# Altium footprint library 学习.PcbLib: 96 footprints (part 3 of 6)
Each footprint in its own frame and in the unit in brackets; x right, y up, seen from the top. Pads: shape width x height; smd on the part's side, far side on the other; paste and mask are expansions set on the pad; w line width, h text height; cw(c..) or ccw(c..) is an arc to the next point about the centre after c.
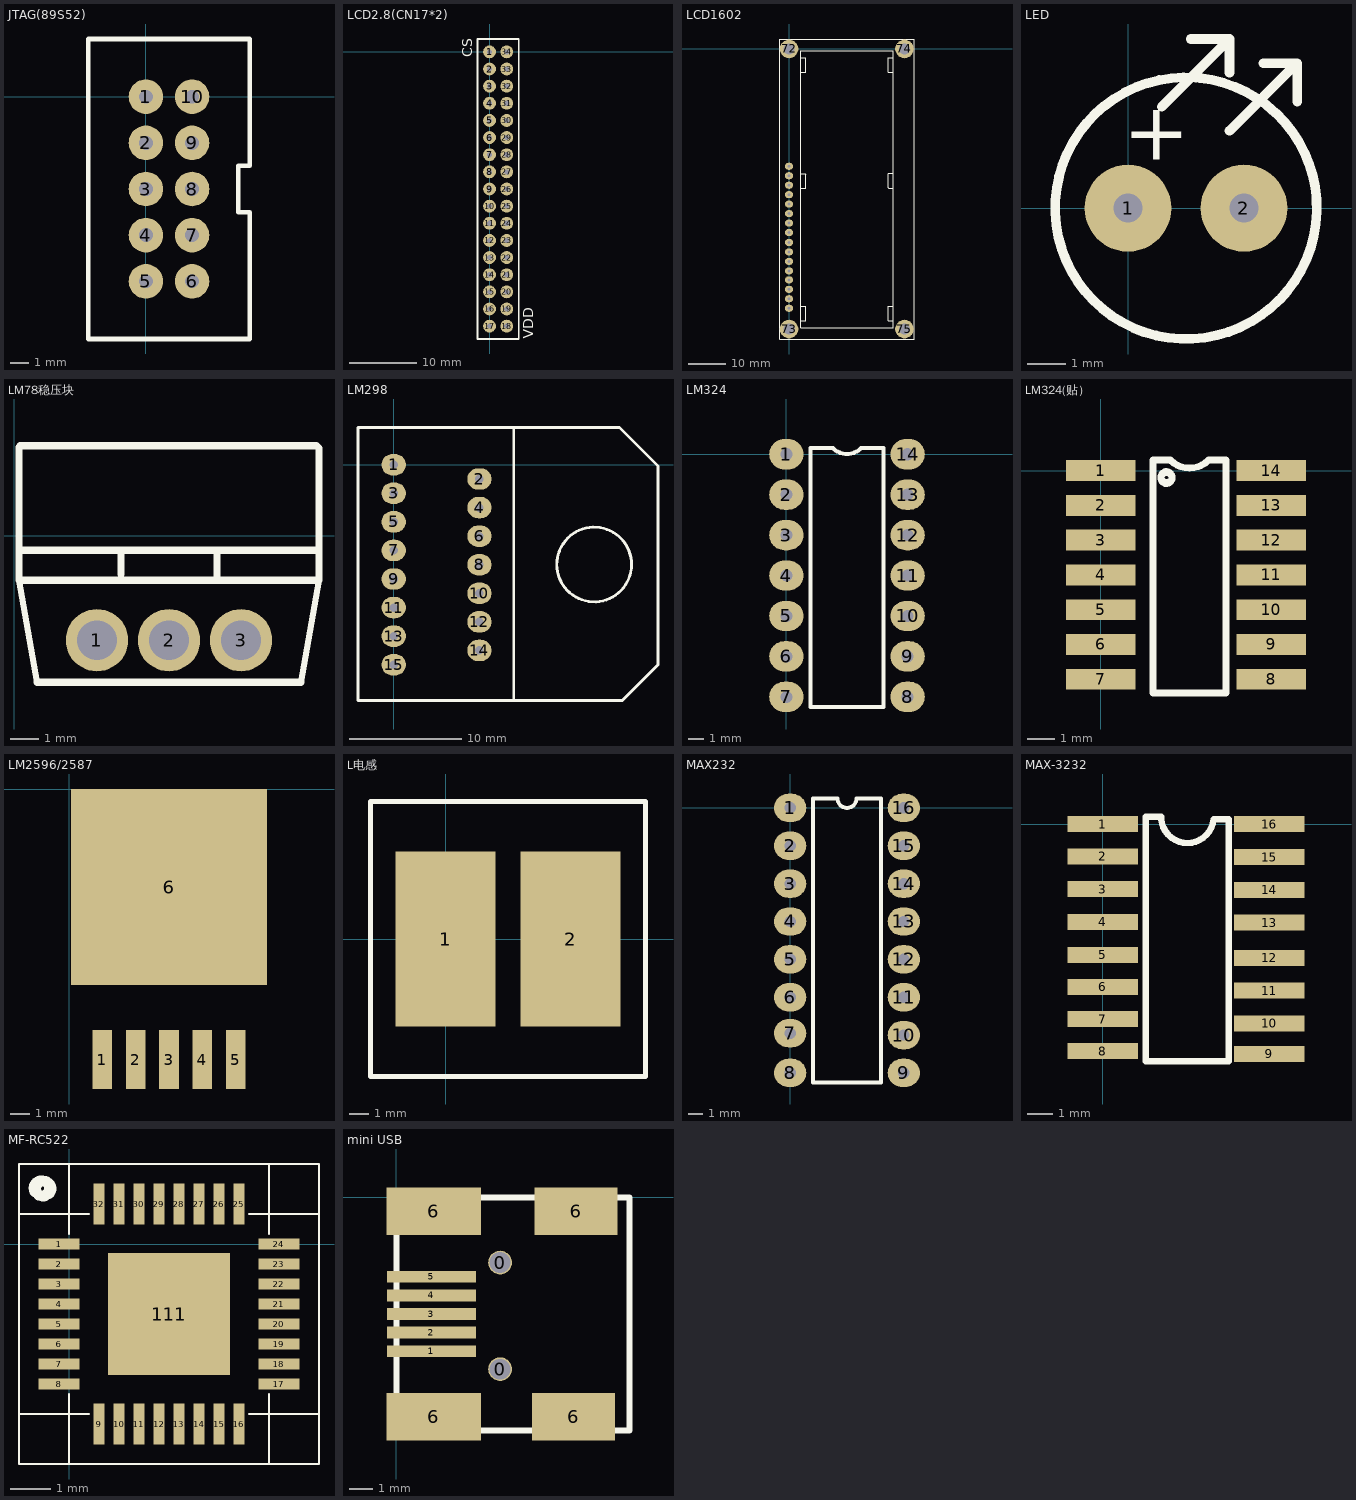
[diagram p2: the footprints below, top view; thin cyan lines are the x and y axes]

## JTAG(89S52) [mil]
pads (10):
  round 75 hole 30: 1(0,0) 2(0,-100) 3(0,-200) 4(0,-300) 5(0,-400) 6(100,-400) 7(100,-300) 8(100,-200) 9(100,-100) 10(100,0)
Top Overlay:
  lines w10: -55,125 0,125 225,125 225,-150 200,-150 200,-250 225,-250 225,-525 -125,-525 -125,125 -65,125 -30,125

## LCD2.8(CN17*2) [mil]
pads (34):
  round 75 hole 30: 1(0,0) 2(0,-100) 3(0,-200) 4(0,-300) 5(0,-400) 6(0,-500) 7(0,-600) 8(0,-700) 9(0,-800) 10(0,-900) 11(0,-1000) 12(0,-1100) 13(0,-1200) 14(0,-1300) 15(0,-1400) 16(0,-1500) 17(0,-1600) 18(100,-1600) 19(100,-1500) 20(100,-1400) 21(100,-1300) 22(100,-1200) 23(100,-1100) 24(100,-1000) 25(100,-900) 26(100,-800) 27(100,-700) 28(100,-600) 29(100,-500) 30(100,-400) 31(100,-300) 32(100,-200) 33(100,-100) 34(100,0)
Top Overlay:
  lines w10: -70,-1675 -70,75 170,75 170,-1675 -70,-1675
  text "VDD" at 255,-1675 h60
  text "CS" at -100,-30 h60

## LCD1602 [mil]
pads (20):
  oval 86x75 hole 30: 1(0,-2740) 2(0,-2640) 3(0,-2540) 4(0,-2440) 5(0,-2345) 6(0,-2245) 7(0,-2145) 8(0,-2045) 9(0,-1940) 10(0,-1840) 11(0,-1740) 12(0,-1640) 13(0,-1540) 14(0,-1440) 15(0,-1340) 16(0,-1240)
  round 197 hole 120: 72(0,0) 73(0,-2960) 74(1220,0) 75(1220,-2960)
Top Overlay:
  lines w10: 125,-2870 175,-2870 175,-2720 125,-2720 ; 125,-1470 175,-1470 175,-1325 170,-1320 125,-1320 ; 125,-245 175,-245 175,-95 125,-95 ; 125,-90 125,-20 1100,-20 1100,-2945 125,-2945 125,-70 ; 1100,-2865 1100,-2870 1050,-2870 1050,-2720 1100,-2720 ; 1100,-1470 1055,-1470 1050,-1465 1050,-1320 1055,-1315 1100,-1315 ; 1100,-245 1050,-245 1050,-95 1100,-95 ; -100,-3065 1325,-3065 1325,-1195 1325,105 -100,105 -100,-145 -100,-3065

## LED [mil]
pads (2):
  round 90 hole 30: 1(0,0) 2(120,0)
Top Overlay:
  lines w10: 35,105 105,175 ; 65,175 105,175 ; 70,135 ccw(c60,0) 74.17,134.63 ; 105,80 175,150 ; 105,140 105,175 ; 140,150 175,150 ; 175,110 175,150
  text "+" at -5,50 h60

## LM78稳压块 [mil]
pads (3):
  round 86.61 hole 55: 1(115,-145) 2(215,-145) 3(315,-145)
Top Overlay:
  lines w7.87: 148.33,-61.67 148.33,-53.33 ; 148.33,-45 148.33,-36.67 ; 148.33,-28.33 148.33,-20 ; 281.67,-61.67 281.67,-53.33 ; 281.67,-45 281.67,-36.67 ; 281.67,-28.33 281.67,-20 ; 6.67,-61.67 6.67,-20 423.33,-20 423.33,-61.67 ; 6.67,-61.67 31.67,-203.33 398.33,-203.33 423.33,-61.67 ; 6.67,-61.67 423.33,-61.67
  lines w10: 6.67,-5 6.67,-61.67 423.33,-61.67 423.33,-10 ; 31.67,-203.33 398.33,-203.33 ; 148.33,-53.33 148.33,-20 ; 281.67,-61.67 281.67,-20 ; 423.33,-30 423.33,121.67 420,125 8.33,125 6.67,123.33 6.67,-20 423.33,-20

## LM298 [mil]
pads (15):
  oval 85x75 hole 30: 1(0,0) 2(300,-50) 3(0,-100) 4(300,-150) 5(0,-200) 6(300,-250) 7(0,-300) 8(300,-350) 9(0,-400) 10(300,-450) 11(0,-500) 12(300,-550) 13(0,-600) 14(300,-650) 15(0,-700)
Top Overlay:
  lines w10: -20,130 455,130 ; -10,130 -125,130 -125,-825 450,-825 ; 585,-290 ccw(c701.58,-349.25) 586.33,-287.45 ; 925,-440 925,-225 ; 925,-425 925,-700 800,-825 420,-825 420,130 790,130 925,-5 925,-265

## LM324 [mil]
pads (14):
  oval 85x75 hole 30: 1(0,0) 2(0,-100) 3(0,-200) 4(0,-300) 5(0,-400) 6(0,-500) 7(0,-600) 8(300,-600) 9(300,-500) 10(300,-400) 11(300,-300) 12(300,-200) 13(300,-100) 14(300,0)
Top Overlay:
  lines w10: 60,-625 240,-625 240,15 185,15 cw(c150,50) 115,15 60,15 ; 60,15 60,-620 60,15

## LM324(贴） [mil]
pads (14):
  rect 100x30 smd: 1(0,0) 2(0,-50) 3(0,-100) 4(0,-150) 5(0,-200) 6(0,-250) 7(0,-300) 8(245,-300) 9(245,-250) 10(245,-200) 11(245,-150) 12(245,-100) 13(245,-50) 14(245,0)
Top Overlay:
  lines w10: 94.41,-2.68 ccw(c94.41,-10.59) 100,-5 ; 100,-15 cw(c94.41,-9.41) 102.32,-9.41 ; 75,-320 180,-320 180,15 155,15 cw(c127.5,42.5) 100,15 75,15 75,-320

## LM2596/2587 [mm]
pads (6):
  rect 1x3 smd: 1(1.7,-13.8) 2(3.4,-13.8) 3(5.1,-13.8) 4(6.8,-13.8) 5(8.5,-13.8)
  rect 10x10 smd: 6(5.1,-5)

## L电感 [mil]
pads (2):
  rect 200x350 smd: 1(0,0) 2(250,0)
Top Overlay:
  lines w10: -130,275 -150,275 ; -125,275 400,275 400,-275 -150,-275 -150,275 ; -70,275 -150,275

## MAX232 [mil]
pads (16):
  oval 85x75 hole 30: 1(0,0) 2(0,-100) 3(0,-200) 4(0,-300) 5(0,-400) 6(0,-500) 7(0,-595) 8(0,-700) 9(300,-700) 10(300,-600) 11(300,-500) 12(300,-400) 13(300,-300) 14(300,-200) 15(300,-100) 16(300,0)
Top Overlay:
  lines w10: 60,-725 60,25 125,25 ccw(c150,25) 175,25 240,25 240,-725 60,-725

## MAX-3232 [mm]
pads (16):
  rect 2.794x0.635 smd: 1(0,0) 2(0,-1.275) 3(0,-2.575) 4(0,-3.875) 5(0,-5.175) 6(0,-6.45) 7(0,-7.725) 8(0,-9) 9(6.6,-9.1) 10(6.6,-7.9) 11(6.6,-6.6) 12(6.6,-5.3) 13(6.6,-3.9) 14(6.6,-2.6) 15(6.6,-1.3) 16(6.6,0)
Top Overlay:
  lines w0.254: 2.317,0.196 ccw(c3.356,0.3) 4.395,0.2 ; 2.317,0.3 1.7,0.3 1.7,-9.4 5,-9.4 5,0.2 4.395,0.2

## MF-RC522 [mil]
pads (33):
  rect 40x11 smd: 1(-9.84,0) 2(-9.84,-19.68) 3(-9.84,-39.37) 4(-9.84,-59.06) 5(-9.84,-78.74) 6(-9.84,-98.43) 7(-9.84,-118.11) 8(-9.84,-137.8) 17(206.69,-137.8) 18(206.69,-118.11) 19(206.69,-98.43) 20(206.69,-78.74) 21(206.69,-59.06) 22(206.69,-39.37) 23(206.69,-19.68) 24(206.69,0)
  rect 11x40 smd: 9(29.53,-177.17) 10(49.21,-177.17) 11(68.9,-177.17) 12(88.58,-177.17) 13(108.27,-177.17) 14(127.95,-177.17) 15(147.64,-177.17) 16(167.32,-177.17) 25(167.32,39.37) 26(147.64,39.37) 27(127.95,39.37) 28(108.27,39.37) 29(88.58,39.37) 30(68.9,39.37) 31(49.21,39.37) 32(29.53,39.37)
  rect 120x120 smd: 111(98.43,-68.9)
Top Overlay:
  lines w2: -49.21,-167.32 0,-167.32 ; -49.21,29.53 0,29.53 ; 0,-216.54 0,-167.32 ; 0,-147.64 0,-167.32 ; 0,9.84 0,29.53 ; 0,78.74 0,29.53 ; 19.68,-167.32 0,-167.32 ; 19.68,29.53 0,29.53 ; 177.17,-167.32 196.85,-167.32 ; 177.17,29.53 196.85,29.53 ; 196.85,-216.54 196.85,-167.32 ; 196.85,-147.64 196.85,-167.32 ; 196.85,9.84 196.85,29.53 ; 196.85,78.74 196.85,29.53 ; 246.06,-167.32 196.85,-167.32 ; 246.06,29.53 196.85,29.53 ; -49.21,-216.54 246.06,-216.54 246.06,78.74 -49.21,78.74 -49.21,-216.54
  lines w10: -33.73,51.35 cw(c-27.12,54.96) -30,48 ; -23.25,47.21 cw(c-25.01,54.54) -19.68,49.21

## mini USB [mil]
pads (11):
  round 40 hole 35: 0(175,-290) 0(175,-110)
  rect 150x20 smd: 1(59.06,-259.84) 2(59.06,-228.35) 3(59.06,-196.85) 4(59.06,-165.35) 5(59.06,-133.86)
  rect 160x80 smd: 6(62.99,-370.08) 6(62.99,-23.62)
  rect 140x80 smd: 6(299.21,-370.08) 6(303.15,-23.62)
Top Overlay:
  lines w10: 0,-393.7 393.7,-393.7 393.7,0 0,0 0,-393.7

## PCBComponent_1 [mil]

## PCBComponent_1 - duplicate [mil]